# Altium footprint library AOO.PcbLib: 131 footprints (part 5 of 9)
Each footprint in its own frame and in the unit in brackets; x right, y up, seen from the top. Pads: shape width x height; smd on the part's side, far side on the other; paste and mask are expansions set on the pad; w line width, h text height; cw(c..) or ccw(c..) is an arc to the next point about the centre after c.
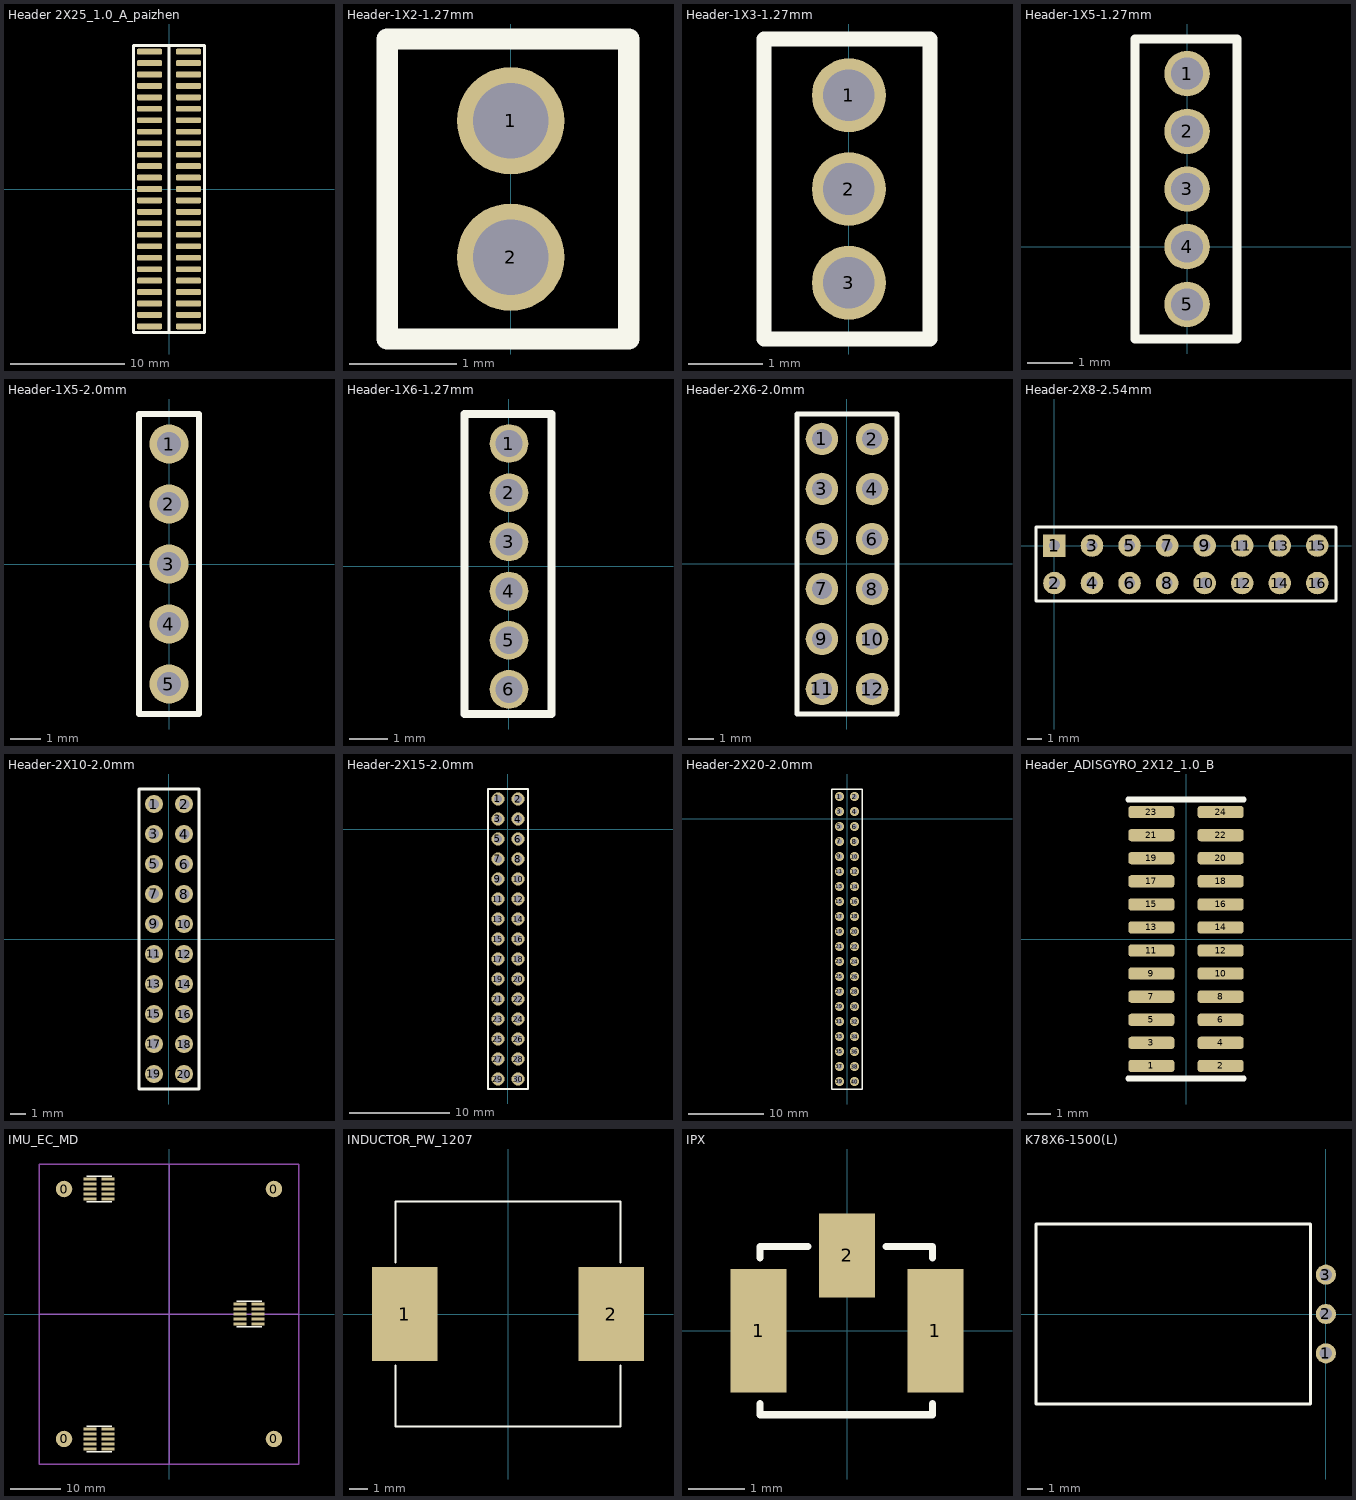
[diagram p4: the footprints below, top view; thin cyan lines are the x and y axes]

## Header 2X25_1.0_A_paizhen [mm]
pads (50):
  rrect50% 2.2x0.5 smd: 1(-1.7,12) 2(1.7,12) 3(-1.7,11) 4(1.7,11) 5(-1.7,10) 6(1.7,10) 7(-1.7,9) 8(1.7,9) 9(-1.7,8) 10(1.7,8) 11(-1.7,7) 12(1.7,7) 13(-1.7,6) 14(1.7,6) 15(-1.7,5) 16(1.7,5) 17(-1.7,4) 18(1.7,4) 19(-1.7,3) 20(1.7,3) 21(-1.7,2) 22(1.7,2) 23(-1.7,1) 24(1.7,1) 25(-1.7,0) 26(1.7,0) 27(-1.7,-1) 28(1.7,-1) 29(-1.7,-2) 30(1.7,-2) 31(-1.7,-3) 32(1.7,-3) 33(-1.7,-4) 34(1.7,-4) 35(-1.7,-5) 36(1.7,-5) 37(-1.7,-6) 38(1.7,-6) 39(-1.7,-7) 40(1.7,-7) 41(-1.7,-8) 42(1.7,-8) 43(-1.7,-9) 44(1.7,-9) 45(-1.7,-10) 46(1.7,-10) 47(-1.7,-11) 48(1.7,-11) 49(-1.7,-12) 50(1.7,-12)
Top Overlay:
  lines w0.254: 0,-12.54 0,12.54 ; -3.1,-12.54 -3.1,12.54 3.1,12.54 3.1,-12.54 -3.1,-12.54

## Header-1X2-1.27mm [mm]
pads (2):
  round 1 hole 0.7: 1(0,3.81) 2(0,2.54)
Top Overlay:
  lines w0.2: -1.15,1.778 -1.15,4.572 1.1,4.572 1.1,1.778 -1.15,1.778

## Header-1X3-1.27mm [mm]
pads (3):
  round 1 hole 0.7: 1(0,3.81) 2(0,2.54) 3(0,1.27)
Top Overlay:
  lines w0.2: -1.15,0.508 1.1,0.508 1.1,4.572 -1.15,4.572 -1.15,0.508
3D body: height 5.02, standoff -2.18, extent -1.15,0.635 1.15,4.445

## Header-1X5-1.27mm [mm]
pads (5):
  round 1 hole 0.7: 1(0,3.81) 2(0,2.54) 3(0,1.27) 4(0,0) 5(0,-1.27)
Top Overlay:
  lines w0.2: -1.15,-2.032 -1.15,4.572 1.1,4.572 1.1,-2.032 -1.15,-2.032
3D body: height 5.02, standoff -2.18, extent -1.15,-1.905 1.15,4.445

## Header-1X5-2.0mm [mm]
pads (5):
  round 1.3 hole 0.8: 1(0,4) 2(0,2) 3(0,0) 4(0,-2) 5(0,-4)
Top Overlay:
  lines w0.2: -1,-5 1,-5 1,5 -1,5 -1,-5
3D body: height 6.02, standoff -2.78, extent -1,-5 1,5

## Header-1X6-1.27mm [mm]
pads (6):
  round 1 hole 0.7: 1(0,3.175) 2(0,1.905) 3(0,0.635) 4(0,-0.635) 5(0,-1.905) 6(0,-3.175)
Top Overlay:
  lines w0.2: -1.15,-3.81 1.1,-3.81 1.1,3.937 -1.15,3.937 -1.15,-3.81
3D body: height 5.02, standoff -2.18, extent -1.15,-3.81 1.15,3.81

## Header-2X6-2.0mm [mm]
pads (12):
  round 1.3 hole 0.8: 1(-1,5) 2(1,5) 3(-1,3) 4(1,3) 5(-1,1) 6(1,1) 7(-1,-1) 8(1,-1) 9(-1,-3) 10(1,-3) 11(-1,-5) 12(1,-5)
Top Overlay:
  lines w0.2: -2,-6 2,-6 2,6 -2,6 -2,-6
3D body: height 6.02, standoff -2.78, extent -2,-6 2,6

## Header-2X8-2.54mm [mil]
pads (16):
  rect 60x60 hole 30: 1(0,0)
  round 60 hole 30: 2(0,-100) 3(100,0) 4(100,-100) 5(200,0) 6(200,-100) 7(300,0) 8(300,-100) 9(400,0) 10(400,-100) 11(500,0) 12(500,-100) 13(600,0) 14(600,-100) 15(700,0) 16(700,-100)
Top Overlay:
  lines w7.87: -49.21,-147.64 750,-147.64 750,49.21 344.49,49.21 -49.21,49.21 -49.21,-147.64

## Header-2X10-2.0mm [mm]
pads (20):
  round 1.2 hole 0.7: 1(-1,9) 2(1,9) 3(-1,7) 4(1,7) 5(-1,5) 6(1,5) 7(-1,3) 8(1,3) 9(-1,1) 10(1,1) 11(-1,-1) 12(1,-1) 13(-1,-3) 14(1,-3) 15(-1,-5) 16(1,-5) 17(-1,-7) 18(1,-7) 19(-1,-9) 20(1,-9)
Top Overlay:
  lines w0.2: -2,-10 2,-10 2,10 -2,10 -2,-10

## Header-2X15-2.0mm [mm]
pads (30):
  round 1.3 hole 0.8: 1(-1,3) 2(1,3) 3(-1,1) 4(1,1) 5(-1,-1) 6(1,-1) 7(-1,-3) 8(1,-3) 9(-1,-5) 10(1,-5) 11(-1,-7) 12(1,-7) 13(-1,-9) 14(1,-9) 15(-1,-11) 16(1,-11) 17(-1,-13) 18(1,-13) 19(-1,-15) 20(1,-15) 21(-1,-17) 22(1,-17) 23(-1,-19) 24(1,-19) 25(-1,-21) 26(1,-21) 27(-1,-23) 28(1,-23) 29(-1,-25) 30(1,-25)
Top Overlay:
  lines w0.2: -2,-26 -2,4 2,4 2,-26 -2,-26
3D body: height 6.02, standoff -2.78, extent -2,-26 2,4

## Header-2X20-2.0mm [mm]
pads (40):
  round 1.2 hole 0.7: 1(-1,3) 2(1,3) 3(-1,1) 4(1,1) 5(-1,-1) 6(1,-1) 7(-1,-3) 8(1,-3) 9(-1,-5) 10(1,-5) 11(-1,-7) 12(1,-7) 13(-1,-9) 14(1,-9) 15(-1,-11) 16(1,-11) 17(-1,-13) 18(1,-13) 19(-1,-15) 20(1,-15) 21(-1,-17) 22(1,-17) 23(-1,-19) 24(1,-19) 25(-1,-21) 26(1,-21) 27(-1,-23) 28(1,-23) 29(-1,-25) 30(1,-25) 31(-1,-27) 32(1,-27) 33(-1,-29) 34(1,-29) 35(-1,-31) 36(1,-31) 37(-1,-33) 38(1,-33) 39(-1,-35) 40(1,-35)
Top Overlay:
  lines w0.2: -2,-36 -2,4 2,4 2,-36 -2,-36
3D body: height 6.02, standoff -2.78, extent -2,-36 2,4

## Header_ADISGYRO_2X12_1.0_B [mm]
pads (24):
  rrect50% 2x0.53 smd: 1(-1.5,-5.5) 2(1.5,-5.5) 3(-1.5,-4.5) 4(1.5,-4.5) 5(-1.5,-3.5) 6(1.5,-3.5) 7(-1.5,-2.5) 8(1.5,-2.5) 9(-1.5,-1.5) 10(1.5,-1.5) 11(-1.5,-0.5) 12(1.5,-0.5) 13(-1.5,0.5) 14(1.5,0.5) 15(-1.5,1.5) 16(1.5,1.5) 17(-1.5,2.5) 18(1.5,2.5) 19(-1.5,3.5) 20(1.5,3.5) 21(-1.5,4.5) 22(1.5,4.5) 23(-1.5,5.5) 24(1.5,5.5)
Top Overlay:
  lines w0.254: -2.5,-6.04 2.5,-6.04 ; -2.5,6.04 2.5,6.04
3D body: height 2.27, standoff 0.02, extent -2,-6 2,6

## IMU_EC_MD [mm]
pads (34):
  round 3.3 smd: 0(-21,-25) 0(-21,25) 0(21,-25) 0(21,25)
  rrect50% 2.6x0.56 smd: 1(-15.8,27) 2(-12.2,27) 3(-15.8,26) 4(-12.2,26) 5(-15.8,25) 6(-12.2,25) 7(-15.8,24) 8(-12.2,24) 9(-15.8,23) 10(-12.2,23) 11(-15.8,-23) 12(-12.2,-23) 13(-15.8,-24) 14(-12.2,-24) 15(-15.8,-25) 16(-12.2,-25) 17(-15.8,-26) 18(-12.2,-26) 19(-15.8,-27) 20(-12.2,-27) 21(14.2,2) 22(17.8,2) 23(14.2,1) 24(17.8,1) 25(14.2,0) 26(17.8,0) 27(14.2,-1) 28(17.8,-1) 29(14.2,-2) 30(17.8,-2)
Top Overlay:
  lines w0.254: -16.5,-27.54 -11.5,-27.54 ; -16.5,-22.46 -11.5,-22.46 ; -16.5,22.46 -11.5,22.46 ; -16.5,27.54 -11.5,27.54 ; 13.5,-2.54 18.5,-2.54 ; 13.5,2.54 18.5,2.54
Mechanical 2:
  lines w0.254: -26,0 26,0 ; 0,-30 0,30 ; -26,-30 26,-30 26,30 -26,30 -26,-30
3D body: height 5.67, standoff 0.02, extent 13.4,-2.5 18.6,2.5
3D body: height 5.67, standoff 0.02, extent -16.6,-27.5 -11.4,-22.5
3D body: height 5.67, standoff 0.02, extent -16.6,22.5 -11.4,27.5

## INDUCTOR_PW_1207 [mm]
height 1
pads (2):
  rect 3.5x5 smd: 1(-5.5,0) 2(5.5,0)
Top Overlay:
  lines w0.127: -6,-2.75 -6,-6 6,-6 6,-2.75 ; -6,2.75 -6,6 6,6 6,2.75
3D body: height 7.52, standoff 0.02, extent -6,-6 6,6

## IPX [mm] "Buzzer_Smd_Passive_5030"
pads (3):
  rect 1x2.2 smd: 1(-1.578,0) 1(1.577,0)
  rect 1x1.5 smd: 2(0,1.346)
Top Overlay:
  lines w0.127: -1.55,-1.3 -1.55,-1.5 1.524,-1.5 1.524,-1.3 ; -1.55,1.3 -1.55,1.5 -0.7,1.5 ; 0.7,1.5 1.524,1.5 1.524,1.3
3D body: height 1.32, standoff 0.02, extent -1.5,-1.55 1.5,1.55

## K78X6-1500(L) [mm]
pads (3):
  round 1.3 hole 0.8: 1(0,-2.54) 2(0,0) 3(0,2.54)
Top Overlay:
  lines w0.2: -18.7,-5.8 -1,-5.8 -1,5.8 -18.7,5.8 -18.7,-5.8
3D body: height 9.02, standoff -2.48, extent -18.7,-5.75 0.3,5.75